# Altium footprint library ref-packages.PCBLIB: 1544 footprints (part 58 of 103)
Each footprint in its own frame and in the unit in brackets; x right, y up, seen from the top. Pads: shape width x height; smd on the part's side, far side on the other; paste and mask are expansions set on the pad; w line width, h text height; cw(c..) or ccw(c..) is an arc to the next point about the centre after c.
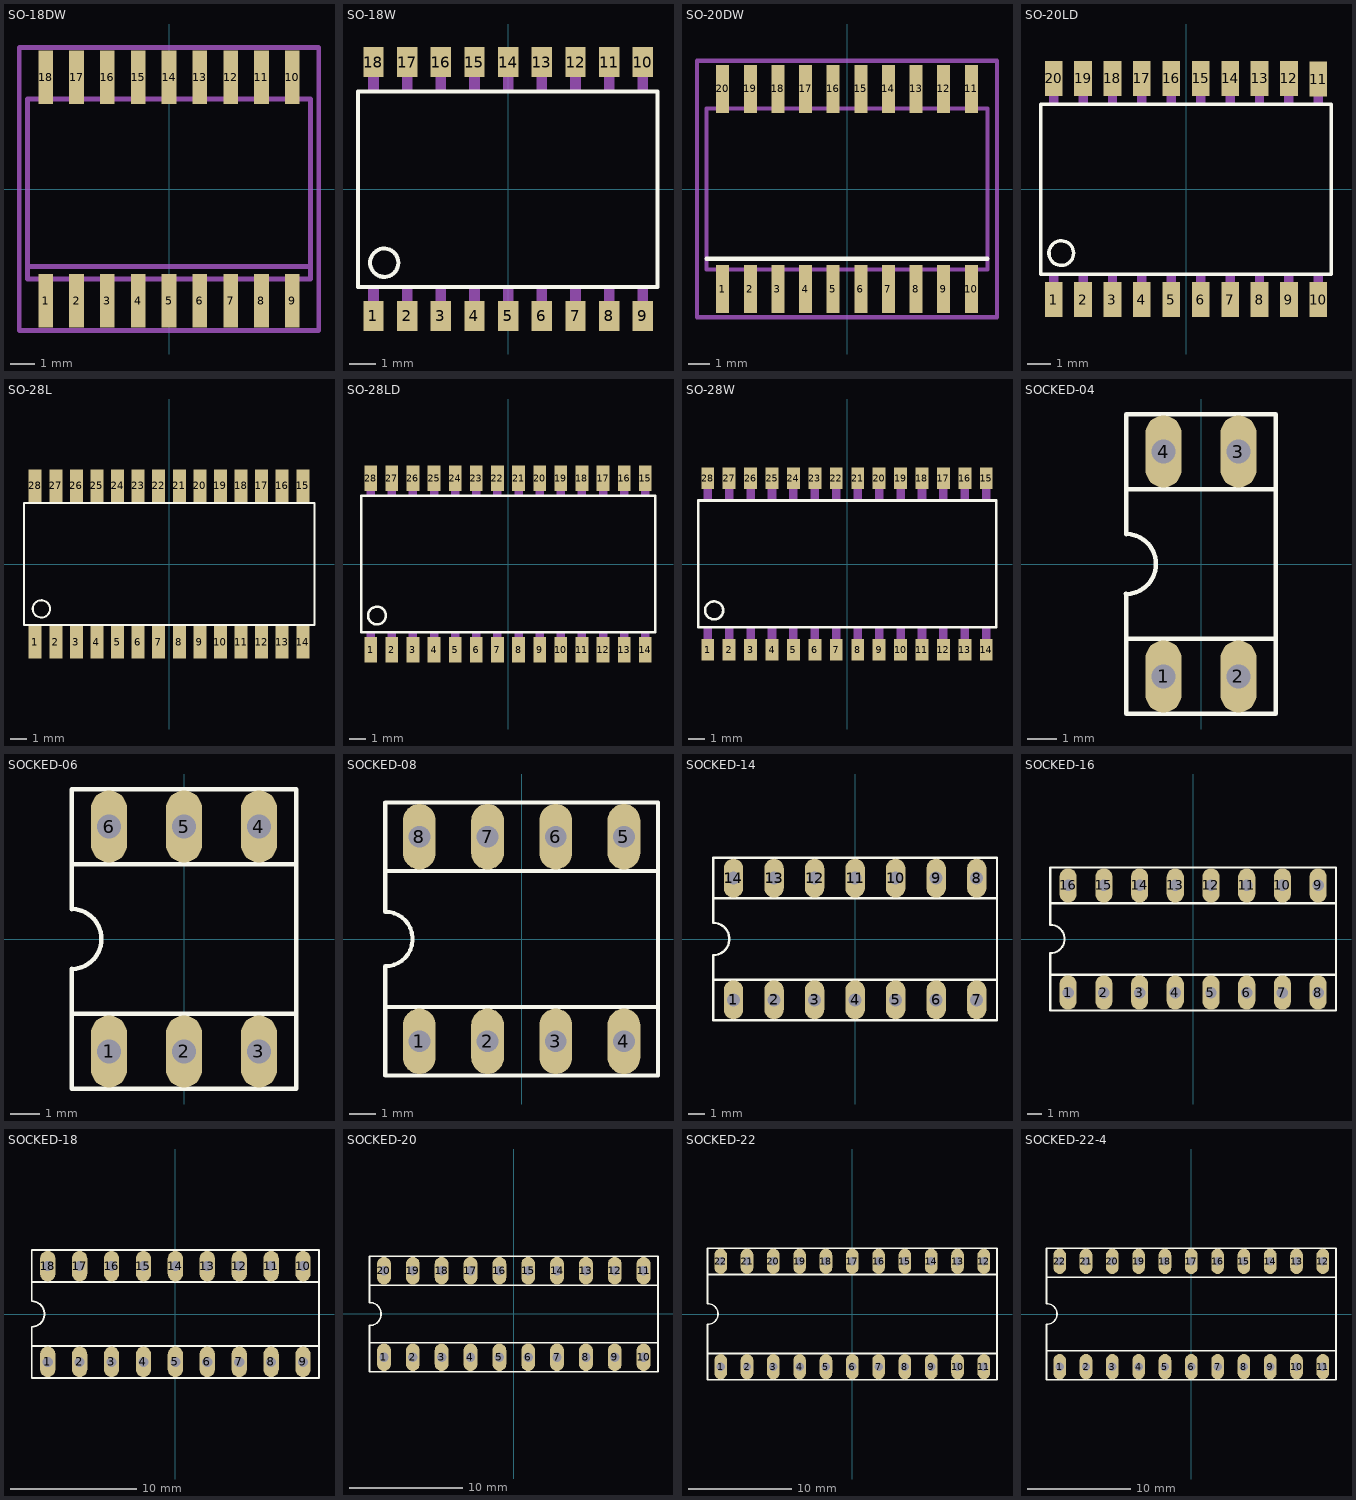
[diagram p57: the footprints below, top view; thin cyan lines are the x and y axes]

## SO-18DW [mil]
pads (18):
  rect 23.62x86.61 smd: 1(-200,-181.1) 2(-150,-181.1) 3(-100,-181.1) 4(-50,-181.1) 5(0,-181.1) 6(50,-181.1) 7(100,-181.1) 8(150,-181.1) 9(200,-181.1) 10(200,181.1) 11(150,181.1) 12(100,181.1) 13(50,181.1) 14(0,181.1) 15(-50,181.1) 16(-100,181.1) 17(-150,181.1) 18(-200,181.1)
Mechanical 16:
  rectangle: -209.65,-209.45 -190.35,-149.61
  rectangle: -159.65,-209.45 -140.35,-149.61
  rectangle: -109.65,-209.45 -90.35,-149.61
  rectangle: -59.65,-209.45 -40.35,-149.61
  rectangle: -9.65,-209.45 9.65,-149.61
  rectangle: 40.35,-209.45 59.65,-149.61
  rectangle: 90.35,-209.45 109.65,-149.61
  rectangle: 140.35,-209.45 159.65,-149.61
  rectangle: 190.35,-209.45 209.65,-149.61
  rectangle: 190.35,149.61 209.65,209.45
  rectangle: 140.35,149.61 159.65,209.45
  rectangle: 90.35,149.61 109.65,209.45
  rectangle: 40.35,149.61 59.65,209.45
  rectangle: -9.65,149.61 9.65,209.45
  rectangle: -59.65,149.61 -40.35,209.45
  rectangle: -109.65,149.61 -90.35,209.45
  rectangle: -159.65,149.61 -140.35,209.45
  rectangle: -209.65,149.61 -190.35,209.45
  lines w8: -229.33,-125.98 -229.33,-145.67 229.33,-145.67 229.33,-125.98 ; -229.33,-125.98 -229.33,145.67 229.33,145.67 229.33,-125.98 ; -229.33,-125.98 229.33,-125.98
Mechanical 27:
  lines w7.87: -242.99,-229.49 -242.99,229.49 243,229.5 242.99,-229.49 -242.99,-229.49

## SO-18W [mil]
pads (18):
  rect 30x45 smd: 1(-200,-188.5) 2(-150,-188.5) 3(-100,-188.5) 4(-50,-188.5) 5(0,-188.5) 6(50,-188.5) 7(100,-188.5) 8(150,-188.5) 9(200,-188.5) 10(200,188.5) 11(150,188.5) 12(100,188.5) 13(50,188.5) 14(0,188.5) 15(-50,188.5) 16(-100,188.5) 17(-150,188.5) 18(-200,188.5)
Top Overlay:
  circle w6: c-184,-109.5 r21
  lines w6: -223,-145.5 222,-145.5 222,144.5 -223,144.5 -223,-145.5
Mechanical 16:
  rectangle: 192,146.5 208,199.5
  rectangle: 142,146.5 158,199.5
  rectangle: 92,146.5 108,199.5
  rectangle: 42,146.5 58,199.5
  rectangle: -8,146.5 8,199.5
  rectangle: -58,146.5 -42,199.5
  rectangle: -108,146.5 -92,199.5
  rectangle: -158,146.5 -142,199.5
  rectangle: -208,146.5 -192,199.5
  rectangle: -208,-200.5 -192,-147.5
  rectangle: -158,-200.5 -142,-147.5
  rectangle: -108,-200.5 -92,-147.5
  rectangle: -58,-200.5 -42,-147.5
  rectangle: -8,-200.5 8,-147.5
  rectangle: 42,-200.5 58,-147.5
  rectangle: 92,-200.5 108,-147.5
  rectangle: 142,-200.5 158,-147.5
  rectangle: 192,-200.5 208,-147.5

## SO-20DW [mil]
pads (20):
  rect 23.62x86.61 smd: 1(-225,-181.1) 2(-175,-181.1) 3(-125,-181.1) 4(-75,-181.1) 5(-25,-181.1) 6(25,-181.1) 7(75,-181.1) 8(125,-181.1) 9(175,-181.1) 10(225,-181.1) 11(225,181.1) 12(175,181.1) 13(125,181.1) 14(75,181.1) 15(25,181.1) 16(-25,181.1) 17(-75,181.1) 18(-125,181.1) 19(-175,181.1) 20(-225,181.1)
Top Overlay:
  lines w8: -254.33,-125.98 254.33,-125.98
Mechanical 16:
  rectangle: -234.65,-209.45 -215.35,-149.61
  rectangle: -184.65,-209.45 -165.35,-149.61
  rectangle: -134.65,-209.45 -115.35,-149.61
  rectangle: -84.65,-209.45 -65.35,-149.61
  rectangle: -34.65,-209.45 -15.35,-149.61
  rectangle: 15.35,-209.45 34.65,-149.61
  rectangle: 65.35,-209.45 84.65,-149.61
  rectangle: 115.35,-209.45 134.65,-149.61
  rectangle: 165.35,-209.45 184.65,-149.61
  rectangle: 215.35,-209.45 234.65,-149.61
  rectangle: 215.35,149.61 234.65,209.45
  rectangle: 165.35,149.61 184.65,209.45
  rectangle: 115.35,149.61 134.65,209.45
  rectangle: 65.35,149.61 84.65,209.45
  rectangle: 15.35,149.61 34.65,209.45
  rectangle: -34.65,149.61 -15.35,209.45
  rectangle: -84.65,149.61 -65.35,209.45
  rectangle: -134.65,149.61 -115.35,209.45
  rectangle: -184.65,149.61 -165.35,209.45
  rectangle: -234.65,149.61 -215.35,209.45
  lines w8: -254.33,-145.67 254.33,-145.67 254.33,145.67 -254.33,145.67 -254.33,-145.67
Mechanical 27:
  lines w7.87: -271.46,-232.28 271.46,-232.28 271.46,232.28 -271.46,232.28 -271.46,-232.28

## SO-20LD [mil]
pads (20):
  rect 30x60 smd: 1(-225,-188) 2(-175,-188) 3(-125,-188) 4(-75,-188) 5(-25,-188) 6(25,-188) 7(75,-188) 8(125,-188) 9(175,-188) 10(225,-188) 11(225,187) 12(175,188) 13(125,188) 14(75,188) 15(25,188) 16(-25,188) 17(-75,188) 18(-125,188) 19(-175,188) 20(-225,188)
Top Overlay:
  circle w6: c-212,-109 r21
  lines w6: -247,-145 247,-145 247,144 -247,144 -247,-145
Mechanical 16:
  rectangle: 217,146 233,198
  rectangle: 167,146 183,198
  rectangle: 117,146 133,198
  rectangle: 67,146 83,198
  rectangle: 17,146 33,198
  rectangle: -33,146 -17,198
  rectangle: -83,146 -67,198
  rectangle: -133,146 -117,198
  rectangle: -183,146 -167,198
  rectangle: -233,146 -217,198
  rectangle: 217,-199 233,-147
  rectangle: 167,-199 183,-147
  rectangle: 117,-199 133,-147
  rectangle: 67,-199 83,-147
  rectangle: 17,-199 33,-147
  rectangle: -33,-199 -17,-147
  rectangle: -83,-199 -67,-147
  rectangle: -133,-199 -117,-147
  rectangle: -183,-199 -167,-147
  rectangle: -233,-199 -217,-147

## SO-28L [mil]
pads (28):
  rect 31.5x78.74 smd: 1(-325,-190) 2(-275,-190) 3(-225,-190) 4(-175,-190) 5(-125,-190) 6(-75,-190) 7(-25,-190) 8(25,-190) 9(75,-190) 10(125,-190) 11(175,-190) 12(225,-190) 13(275,-190) 14(325,-190) 15(325,190) 16(275,190) 17(225,190) 18(175,190) 19(125,190) 20(75,190) 21(25,190) 22(-25,190) 23(-75,190) 24(-125,190) 25(-175,190) 26(-225,190) 27(-275,190) 28(-325,190)
Top Overlay:
  circle w5: c-310,-109 r21
  lines w5: -352,-148 353,-148 353,148 -352,148 -352,-148
Mechanical 16:
  rectangle: -335,-209 -315,-149
  rectangle: -285,-209 -265,-149
  rectangle: -235,-209 -215,-149
  rectangle: -185,-209 -165,-149
  rectangle: -135,-209 -115,-149
  rectangle: -85,-209 -65,-149
  rectangle: -35,-209 -15,-149
  rectangle: 15,-209 35,-149
  rectangle: 65,-209 85,-149
  rectangle: 115,-209 135,-149
  rectangle: 165,-209 185,-149
  rectangle: 215,-209 235,-149
  rectangle: 265,-209 285,-149
  rectangle: 315,-209 335,-149
  rectangle: 315,149 335,209
  rectangle: 265,149 285,209
  rectangle: 215,149 235,209
  rectangle: 165,149 185,209
  rectangle: 115,149 135,209
  rectangle: 65,149 85,209
  rectangle: 15,149 35,209
  rectangle: -35,149 -15,209
  rectangle: -85,149 -65,209
  rectangle: -135,149 -115,209
  rectangle: -185,149 -165,209
  rectangle: -235,149 -215,209
  rectangle: -285,149 -265,209
  rectangle: -335,149 -315,209

## SO-28LD [mil]
pads (28):
  rect 30x60 smd: 1(-325,-203) 2(-275,-203) 3(-225,-203) 4(-175,-203) 5(-125,-203) 6(-75,-203) 7(-25,-203) 8(25,-203) 9(75,-203) 10(125,-203) 11(175,-203) 12(225,-203) 13(275,-203) 14(325,-203) 15(325,203) 16(275,203) 17(225,203) 18(175,203) 19(125,203) 20(75,203) 21(25,203) 22(-25,203) 23(-75,203) 24(-125,203) 25(-175,203) 26(-225,203) 27(-275,203) 28(-325,203)
Top Overlay:
  circle w6: c-310,-122 r21
  lines w6: -347,-161 348,-161 348,161 -347,161 -347,-161
Mechanical 16:
  rectangle: -335,-222 -315,-162
  rectangle: -285,-222 -265,-162
  rectangle: -235,-222 -215,-162
  rectangle: -185,-222 -165,-162
  rectangle: -135,-222 -115,-162
  rectangle: -85,-222 -65,-162
  rectangle: -35,-222 -15,-162
  rectangle: 15,-222 35,-162
  rectangle: 65,-222 85,-162
  rectangle: 115,-222 135,-162
  rectangle: 165,-222 185,-162
  rectangle: 215,-222 235,-162
  rectangle: 265,-222 285,-162
  rectangle: 315,-222 335,-162
  rectangle: 315,162 335,222
  rectangle: 265,162 285,222
  rectangle: 215,162 235,222
  rectangle: 165,162 185,222
  rectangle: 115,162 135,222
  rectangle: 65,162 85,222
  rectangle: 15,162 35,222
  rectangle: -35,162 -15,222
  rectangle: -85,162 -65,222
  rectangle: -135,162 -115,222
  rectangle: -185,162 -165,222
  rectangle: -235,162 -215,222
  rectangle: -285,162 -265,222
  rectangle: -335,162 -315,222

## SO-28W [mil]
pads (28):
  rect 30x50 smd: 1(-325,-200) 2(-275,-200) 3(-225,-200) 4(-175,-200) 5(-125,-200) 6(-75,-200) 7(-25,-200) 8(25,-200) 9(75,-200) 10(125,-200) 11(175,-200) 12(225,-200) 13(275,-200) 14(325,-200) 15(325,200) 16(275,200) 17(225,200) 18(175,200) 19(125,200) 20(75,200) 21(25,200) 22(-25,200) 23(-75,200) 24(-125,200) 25(-175,200) 26(-225,200) 27(-275,200) 28(-325,200)
Top Overlay:
  circle w6: c-310,-108.25 r21
  lines w6: -347,-147.25 348,-147.25 348,148.16 -347,148.16 -347,-147.25
Mechanical 16:
  rectangle: -335,-208.25 -315,-148.25
  rectangle: -285,-208.25 -265,-148.25
  rectangle: -235,-208.25 -215,-148.25
  rectangle: -185,-208.25 -165,-148.25
  rectangle: -135,-208.25 -115,-148.25
  rectangle: -85,-208.25 -65,-148.25
  rectangle: -35,-208.25 -15,-148.25
  rectangle: 15,-208.25 35,-148.25
  rectangle: 65,-208.25 85,-148.25
  rectangle: 115,-208.25 135,-148.25
  rectangle: 165,-208.25 185,-148.25
  rectangle: 215,-208.25 235,-148.25
  rectangle: 265,-208.25 285,-148.25
  rectangle: 315,-208.25 335,-148.25
  rectangle: 315,149.16 335,209.16
  rectangle: 265,149.16 285,209.16
  rectangle: 215,149.16 235,209.16
  rectangle: 165,149.16 185,209.16
  rectangle: 115,149.16 135,209.16
  rectangle: 65,149.16 85,209.16
  rectangle: 15,149.16 35,209.16
  rectangle: -35,149.16 -15,209.16
  rectangle: -85,149.16 -65,209.16
  rectangle: -135,149.16 -115,209.16
  rectangle: -185,149.16 -165,209.16
  rectangle: -235,149.16 -215,209.16
  rectangle: -285,149.16 -265,209.16
  rectangle: -335,149.16 -315,209.16

## SOCKED-04 [mil]
pads (4):
  oval 48x96 hole 32: 1(-50,-150) 2(50,-150) 3(50,150) 4(-50,150)
Top Overlay:
  lines w6: -100,-100 -100,-200 100,-200 100,-100 ; -100,-100 100,-100 ; -100,-100 -100,-40 ccw(c-100,0) -100,40 -100,100 ; -100,100 -100,200 100,200 100,100 ; -100,100 100,100 ; 100,-100 100,100

## SOCKED-06 [mil]
pads (6):
  oval 48x96 hole 32: 1(-100,-150) 2(0,-150) 3(100,-150) 4(100,150) 5(0,150) 6(-100,150)
Top Overlay:
  lines w6: -150,-100 -150,-200 150,-200 150,-100 ; -150,-100 150,-100 ; -150,-100 -150,-40 ccw(c-150,0) -150,40 -150,100 ; -150,100 -150,200 150,200 150,100 ; -150,100 150,100 ; 150,-100 150,100

## SOCKED-08 [mil]
pads (8):
  oval 48x96 hole 32: 1(-150,-150) 2(-50,-150) 3(50,-150) 4(150,-150) 5(150,150) 6(50,150) 7(-50,150) 8(-150,150)
Top Overlay:
  lines w6: -200,-100 -200,-200 200,-200 200,-100 ; -200,-100 200,-100 ; -200,-100 -200,-40 ccw(c-200,0) -200,40 -200,100 ; -200,100 -200,200 200,200 200,100 ; -200,100 200,100 ; 200,-100 200,100

## SOCKED-14 [mil]
pads (14):
  oval 48x96 hole 32: 1(-300,-150) 2(-200,-150) 3(-100,-150) 4(0,-150) 5(100,-150) 6(200,-150) 7(300,-150) 8(300,150) 9(200,150) 10(100,150) 11(0,150) 12(-100,150) 13(-200,150) 14(-300,150)
Top Overlay:
  lines w6: -350,-100 -350,-200 350,-200 350,-100 ; -350,-100 350,-100 ; -350,-100 -350,-40 ccw(c-350,0) -350,40 -350,100 ; -350,100 -350,200 350,200 350,100 ; -350,100 350,100 ; 350,-100 350,100

## SOCKED-16 [mil]
pads (16):
  oval 48x96 hole 32: 1(-350,-150) 2(-250,-150) 3(-150,-150) 4(-50,-150) 5(50,-150) 6(150,-150) 7(250,-150) 8(350,-150) 9(350,150) 10(250,150) 11(150,150) 12(50,150) 13(-50,150) 14(-150,150) 15(-250,150) 16(-350,150)
Top Overlay:
  lines w6: -400,-100 -400,-200 400,-200 400,-100 ; -400,-100 400,-100 ; -400,-100 -400,-40 ccw(c-400,0) -400,40 -400,100 ; -400,100 -400,200 400,200 400,100 ; -400,100 400,100 ; 400,-100 400,100

## SOCKED-18 [mil]
pads (18):
  oval 48x96 hole 32: 1(-400,-150) 2(-300,-150) 3(-200,-150) 4(-100,-150) 5(0,-150) 6(100,-150) 7(200,-150) 8(300,-150) 9(400,-150) 10(400,150) 11(300,150) 12(200,150) 13(100,150) 14(0,150) 15(-100,150) 16(-200,150) 17(-300,150) 18(-400,150)
Top Overlay:
  lines w6: -450,-100 -450,-200 450,-200 450,-100 ; -450,-100 450,-100 ; -450,-100 -450,-40 ccw(c-450,0) -450,40 -450,100 ; -450,100 -450,200 450,200 450,100 ; -450,100 450,100 ; 450,-100 450,100

## SOCKED-20 [mil]
pads (20):
  oval 48x96 hole 32: 1(-450,-150) 2(-350,-150) 3(-250,-150) 4(-150,-150) 5(-50,-150) 6(50,-150) 7(150,-150) 8(250,-150) 9(350,-150) 10(450,-150) 11(450,150) 12(350,150) 13(250,150) 14(150,150) 15(50,150) 16(-50,150) 17(-150,150) 18(-250,150) 19(-350,150) 20(-450,150)
Top Overlay:
  lines w6: -500,-100 -500,-200 500,-200 500,-100 ; -500,-100 500,-100 ; -500,-100 -500,-40 ccw(c-500,0) -500,40 -500,100 ; -500,100 -500,200 500,200 500,100 ; -500,100 500,100 ; 500,-100 500,100

## SOCKED-22 [mil]
pads (22):
  oval 48x96 hole 32: 1(-500,-200) 2(-400,-200) 3(-300,-200) 4(-200,-200) 5(-100,-200) 6(0,-200) 7(100,-200) 8(200,-200) 9(300,-200) 10(400,-200) 11(500,-200) 12(500,200) 13(400,200) 14(300,200) 15(200,200) 16(100,200) 17(0,200) 18(-100,200) 19(-200,200) 20(-300,200) 21(-400,200) 22(-500,200)
Top Overlay:
  lines w6: -550,-150 -550,-250 550,-250 550,-150 ; -550,-150 550,-150 ; -550,-150 -550,-40 ccw(c-550,0) -550,40 -550,150 ; -550,150 -550,250 550,250 550,150 ; -550,150 550,150 ; 550,-150 550,150

## SOCKED-22-4 [mil]
pads (22):
  oval 48x96 hole 32: 1(-500,-200) 2(-400,-200) 3(-300,-200) 4(-200,-200) 5(-100,-200) 6(0,-200) 7(100,-200) 8(200,-200) 9(300,-200) 10(400,-200) 11(500,-200) 12(500,200) 13(400,200) 14(300,200) 15(200,200) 16(100,200) 17(0,200) 18(-100,200) 19(-200,200) 20(-300,200) 21(-400,200) 22(-500,200)
Top Overlay:
  lines w6: -550,-140 550,-140 ; -550,-140 -550,-250 550,-250 550,-140 ; -550,-140 -550,-40 ccw(c-550,0) -550,40 -550,140 ; -550,140 550,140 ; -550,140 -550,250 550,250 550,140 ; 550,-140 550,140